# Altium footprint library 20210518.PcbLib: 414 footprints (part 19 of 26)
Each footprint in its own frame and in the unit in brackets; x right, y up, seen from the top. Pads: shape width x height; smd on the part's side, far side on the other; paste and mask are expansions set on the pad; w line width, h text height; cw(c..) or ccw(c..) is an arc to the next point about the centre after c.
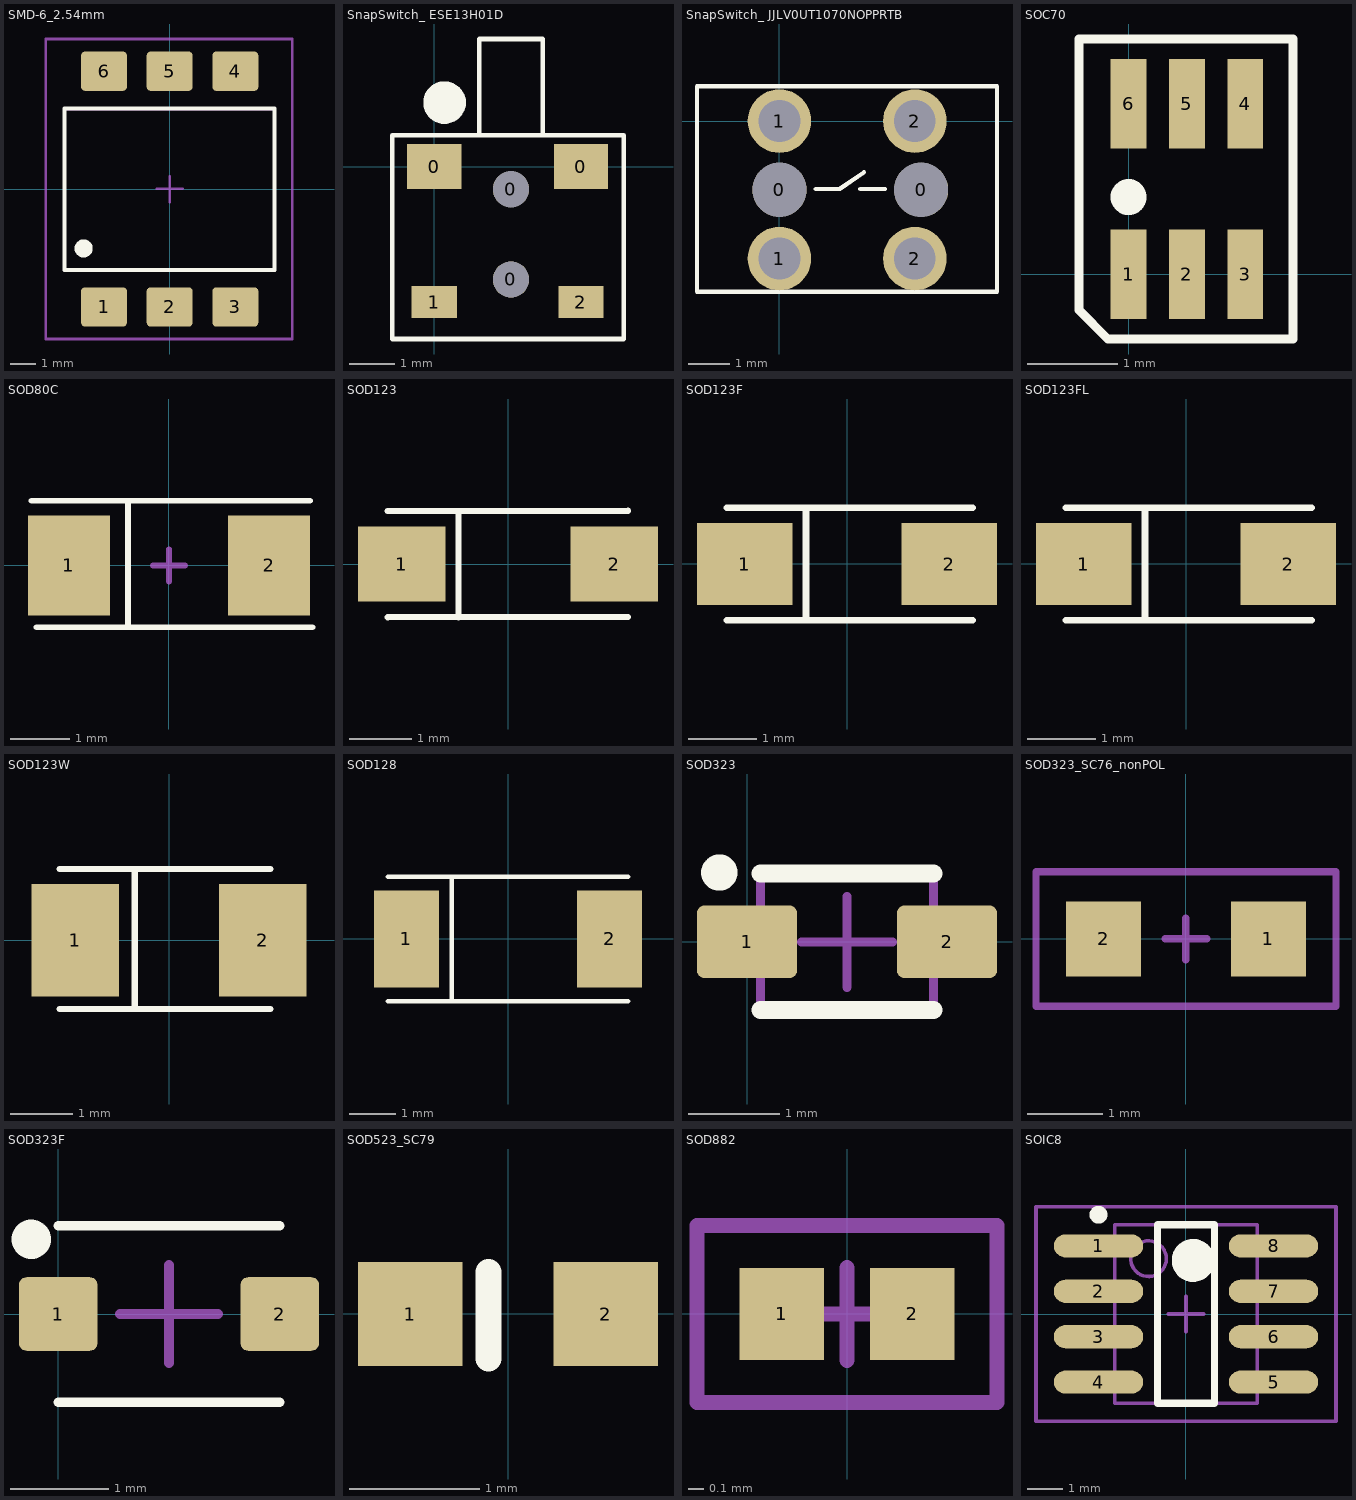
[diagram p18: the footprints below, top view; thin cyan lines are the x and y axes]

## SMD-6_2.54mm [mm]
height 1.6
pads (6):
  rrect20% 1.78x1.52 smd: 1(-2.54,-4.56) 2(0,-4.56) 3(2.54,-4.56) 4(2.54,4.56) 5(0,4.56) 6(-2.54,4.56)
Top Overlay:
  circle w0.45: c-3.327,-2.296 r0.125
  lines w0.15: -4.064,-3.134 -4.064,3.114 4.064,3.114 4.064,-3.134 -4.064,-3.134
Mechanical 13:
  lines w0.1: -4.064,-3.16 4.064,-3.16 4.064,3.089 -4.064,3.089 -4.064,-3.16
Mechanical 15:
  lines w0.1: -4.801,-5.801 -4.801,5.806 4.75,5.806 4.75,-5.801 -4.789,-5.801 ; -0.491,0.015 0.509,0.015 ; 0.001,-0.502 0.001,0.498
3D body: height 4, standoff -0.08, extent -4.243,-4.542 4.267,4.623

## SnapSwitch_ ESE13H01D [mm]
height 1.2
pads (6):
  rect 1.2x1 smd: 0(0,0) 0(3.25,0)
  round 0.8 hole 0.8: 0(1.7,-2.5) 0(1.7,-0.5)
  rect 1x0.7 smd: 1(0,-3) 2(3.25,-3)
Top Overlay:
  circle w0.5: c0.23,1.42 r0.222
  lines w0.1: 1,0.7 1,2.829 2.4,2.829 2.4,0.7 ; -0.93,-3.82 -0.93,0.7 4.2,0.7 4.2,-3.82 -0.93,-3.82
3D body: height 1.3, standoff -0.33, extent -0.4,-3.69 3.8,2.759

## SnapSwitch_ JJLV0UT1070NOPPRTB [mm] "SWITCH DETECTOR SPST-NO 5MA 5V"
pads (6):
  round 1.3 hole 1.3: 0(0,-1.65) 0(3.4,-1.65)
  round 1.524 hole 1: 1(0,-3.3) 1(0,0) 2(3.25,-3.3) 2(3.25,0)
Top Overlay:
  lines w0.1: 0.87,-1.63 1.44,-1.63 2.03,-1.23 ; 1.94,-1.63 2.53,-1.63 ; -1.98,-4.095 5.22,-4.095 5.22,0.835 -1.98,0.835 -1.98,-4.095
3D body: height 10.7, standoff -2.6, extent -1.68,-3.795 4.92,0.535

## SOC70 [mm] "6-Lead,SC70,EIAJ SC88,1.25mm Wide"
height 1
pads (6):
  rect 0.4x1 smd: 1(0,0) 2(0.65,0) 3(1.3,0) 4(1.3,1.9) 5(0.65,1.9) 6(0,1.9)
Top Overlay:
  circle w0.3: c0,0.86 r0.05
  lines w0.1: -0.55,-0.4 -0.23,-0.72 1.83,-0.72 1.83,2.62 -0.55,2.62 -0.55,-0.4
3D body: height 1.1, standoff 0, extent -0.43,-0.21 1.77,2.19

## SOD80C [mm] "Metal Electrode Face (MELF) Diode; Body 3.5 x 1.6 mm (LxDia)"
height 1.6
pads (2):
  rect 1.4x1.7 smd: 1(-1.7,0) 2(1.7,0)
Top Overlay:
  lines w0.1: -2.34,1.1 2.4,1.1 ; -2.25,-1.05 2.44,-1.05 ; -0.7,-1.05 -0.7,1.07
Mechanical 15:
  lines w0.1: -0.275,0 0.275,0 ; 0,-0.275 0,0.275
3D body: height 1.5, standoff 0, extent -1.75,-0.75 1.75,0.75

## SOD123 [mm]
pads (2):
  rect 1.4x1.2 smd: 1(-1.7,0) 2(1.7,0)
Top Overlay:
  lines w0.1: -1.925,-0.85 1.92,-0.845 ; -1.925,0.85 1.92,0.855 ; -0.79,-0.849 -0.79,0.82
3D body: height 1.44, standoff -0.01, extent -1.925,-0.85 1.925,0.85

## SOD123F [mm]
pads (2):
  rect 1.4x1.2 smd: 1(-1.5,0) 2(1.5,0)
Top Overlay:
  lines w0.1: -1.76,-0.825 1.84,-0.825 ; -1.76,0.825 1.84,0.825 ; -0.6,-0.825 -0.6,0.815
3D body: height 0.95, standoff 0, extent -1.76,-0.825 1.84,0.825

## SOD123FL [mm]
pads (2):
  rect 1.4x1.2 smd: 1(-1.5,0) 2(1.5,0)
Top Overlay:
  lines w0.1: -1.76,-0.825 1.84,-0.825 ; -1.76,0.825 1.84,0.825 ; -0.6,-0.825 -0.6,0.815
3D body: height 0.95, standoff 0.01, extent -1.754,-0.825 1.834,0.825

## SOD123W [mm]
pads (2):
  rect 1.4x1.8 smd: 1(-1.5,0) 2(1.5,0)
Top Overlay:
  lines w0.1: -1.75,-1.1 1.62,-1.1 ; -1.75,1.14 1.62,1.14 ; -0.55,-1.1 -0.55,1.14
3D body: height 1.1, standoff -0.01, extent -1.95,-0.98 2.05,0.92

## SOD128 [mm]
height 4
pads (2):
  rect 1.4x2.1 smd: 1(-2.2,0) 2(2.2,0)
Top Overlay:
  lines w0.1: -2.6,-1.35 2.6,-1.35 ; -2.6,1.35 2.6,1.35 ; -1.22,-1.34 -1.22,1.34
3D body: height 1.11, standoff 0, extent -2.6,-1.35 2.6,1.35

## SOD323 [mm] "SODFL, 2-Leads, Body 1,30x5,35mm, IPC Medium Density"
height 1.14
pads (2):
  rrect20% 1.1x0.8 smd: 1(0,0) 2(2.2,0)
Top Overlay:
  circle w0.3: c-0.305,0.762 r0.05
  lines w0.2: 0.15,-0.75 2.05,-0.75 ; 0.15,0.75 2.05,0.75
Mechanical 13:
  lines w0.1: 0.15,-0.725 0.15,0.725 2.05,0.725 2.05,-0.725 0.15,-0.725
Mechanical 15:
  lines w0.1: 0.6,0 1.6,0 ; 1.1,-0.5 1.1,0.5
3D body: height 1.1, standoff 0, extent -0.2,-0.675 2.4,0.675

## SOD323_SC76_nonPOL [mm]
pads (2):
  rect 1x1 smd: 1(1.1,0) 2(-1.1,0)
Mechanical 15:
  lines w0.1: -0.275,0 0.275,0 ; 0,-0.275 0,0.275 ; -2,-0.9 2,-0.9 2,0.9 -2,0.9 -2,-0.9
3D body: height 0.98, standoff 0.9, extent -0.75,-0.525 -0.5,0.525
3D body: height 0.98, standoff -0.01, extent -1.25,-0.625 1.25,0.625

## SOD323F [mm] "SODFL, 2-Leads, Body 1,30x5,35mm, IPC Medium Density"
height 1.14
pads (2):
  rrect20% 0.8x0.75 smd: 1(0,0) 2(2.26,0)
Top Overlay:
  circle w0.3: c-0.275,0.762 r0.05
  lines w0.1: 0,-0.9 2.26,-0.9 ; 0,0.9 2.26,0.9
Mechanical 15:
  lines w0.1: 0.63,0 1.63,0 ; 1.13,-0.5 1.13,0.5
3D body: height 0.82, standoff 0, extent -0.216,-0.673 2.476,0.673

## SOD523_SC79 [mm]
pads (2):
  rect 0.8x0.8 smd: 1(-0.75,0) 2(0.75,0)
Top Overlay:
  lines w0.2: -0.15,-0.34 -0.15,0.32
3D body: height 0.63, standoff 0.01, extent -0.85,-0.46 0.85,0.44

## SOD882 [mm]
pads (2):
  rect 0.55x0.6 smd: 1(-0.425,0) 2(0.425,0)
Mechanical 15:
  lines w0.1: -0.3,0 0.3,0 ; 0,-0.3 0,0.3 ; -0.975,-0.575 -0.975,0.575 0.975,0.575 0.975,-0.575 -0.975,-0.575
3D body: height 0.49, standoff -0.01, extent -0.511,-0.311 0.511,0.311

## SOIC8 [mm] "SOIC, 8-Leads, Body 5,0x4,0mm (max), Pitch 1,27mm, IPC Low Density"
height 1.75
pads (8):
  oval 2.5x0.65 smd: 1(-2.45,1.905) 2(-2.45,0.635) 3(-2.45,-0.635) 4(-2.45,-1.905) 5(2.45,-1.905) 6(2.45,-0.635) 7(2.45,0.635) 8(2.45,1.905)
Top Overlay:
  circle w0.25: c-2.45,2.78 r0.125
  circle w0.6: c0.2,1.5 r0.3
  lines w0.2: -0.8,-2.5 -0.8,2.5 0.8,2.5 0.8,-2.5 -0.8,-2.5
Mechanical 13:
  circle w0.1: c-1.05,1.55 r0.5
  lines w0.1: -2,-2.5 -2,2.5 2,2.5 2,-2.5 -2,-2.5
Mechanical 15:
  lines w0.1: -0.5,0 0.5,0 ; 0,-0.5 0,0.5 ; -4.2,-3 -4.2,3 4.2,3 4.2,-3 -4.2,-3
3D body: height 1.75, standoff 0, extent -3,-2.45 3,2.45